# Altium schematic symbol library 6-Connectors 连接器.端子.SchLib: 402 symbols (part 3 of 5)
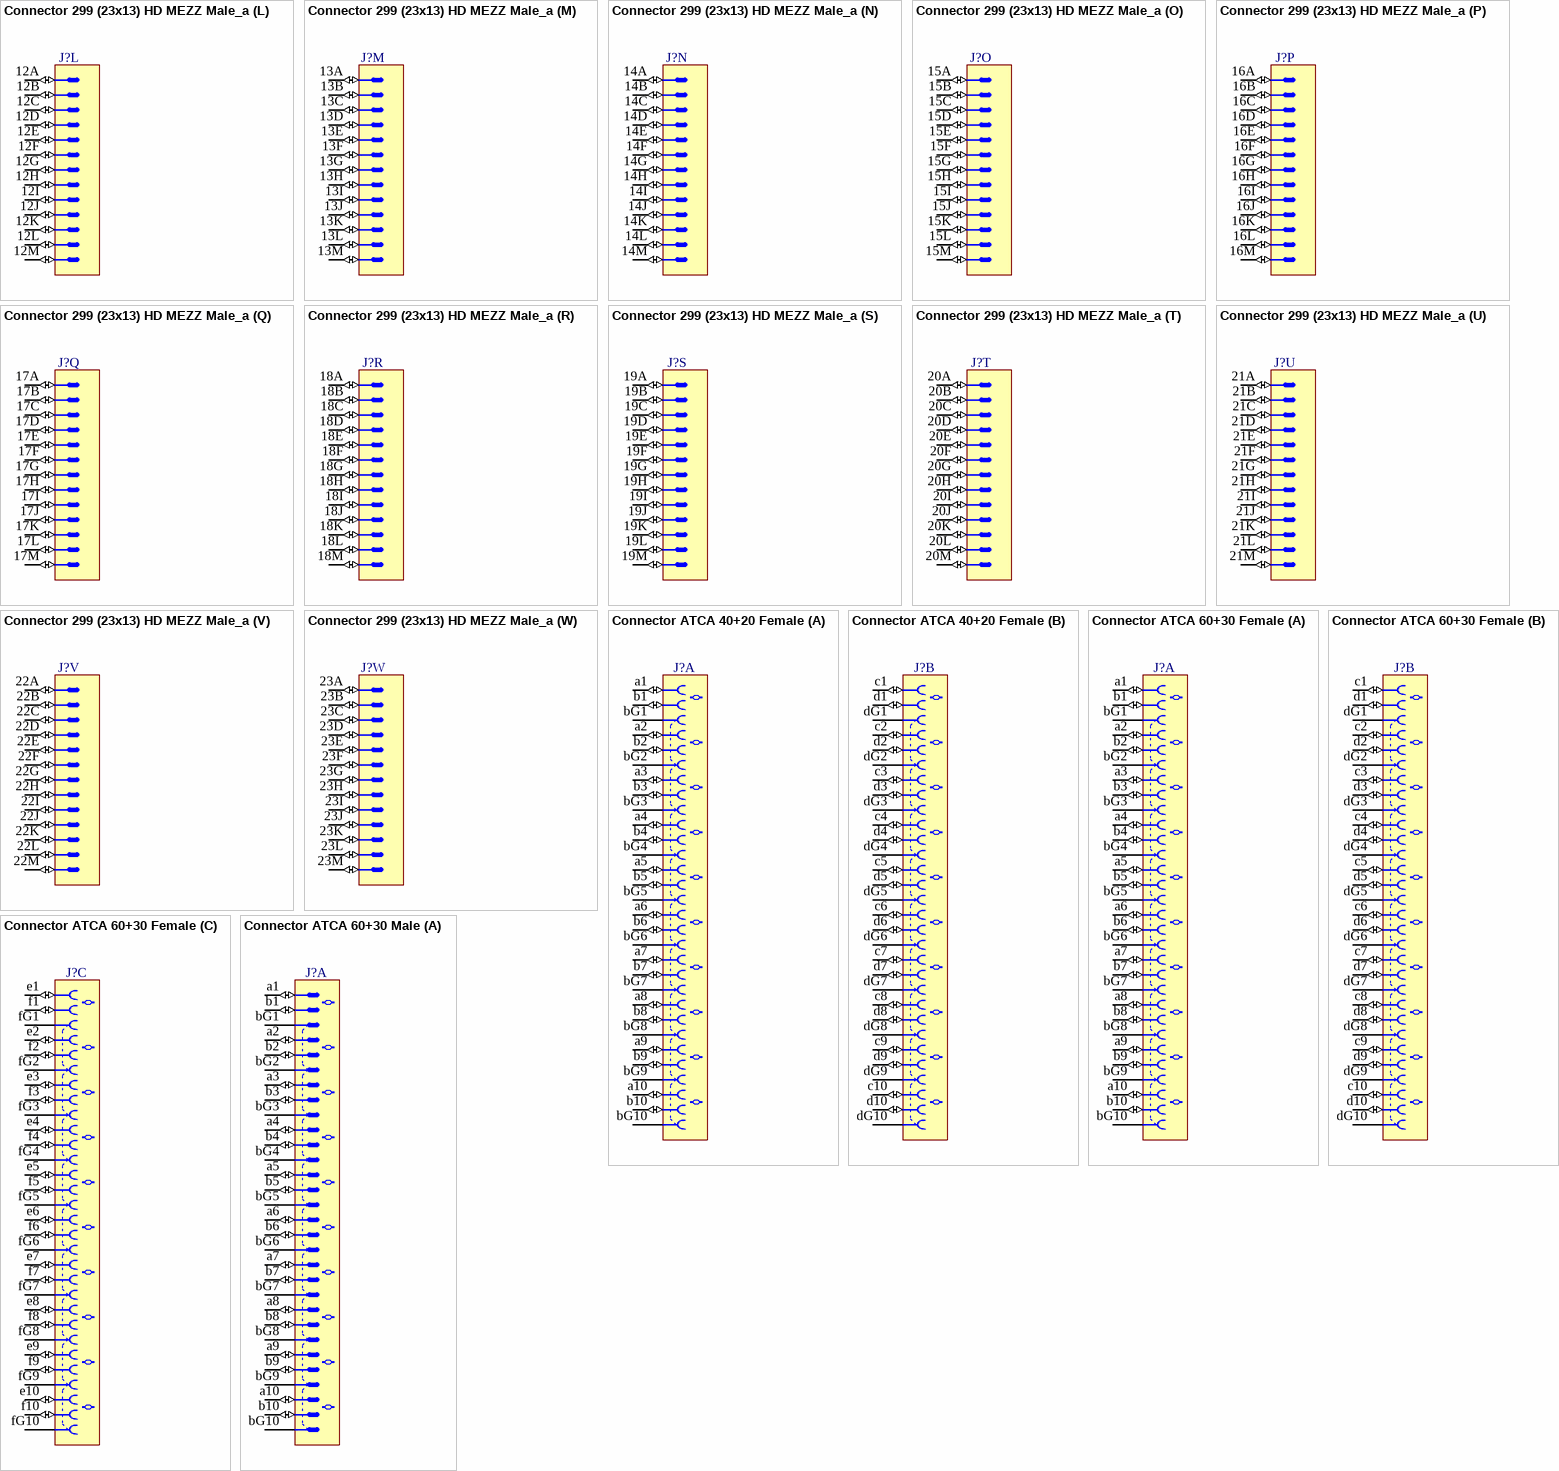
[diagram p51: symbols Connector 299 (23x13) HD MEZZ Male_a to Connector ATCA 60+30 Male]

## Connector 299 (23x13) HD MEZZ Male_a
designator J?
299 Contacts (23 Row  x 13 Column (A to M) HD MEZZ Male Connector
part A pins: 1A (io), 1B (io), 1C (io), 1D (io), 1E (io), 1F (io), 1G (io), 1H (io), 1I (io), 1J (io), 1K (io), 1L (io), 1M (io)
part B pins: 2A (io), 2B (io), 2C (io), 2D (io), 2E (io), 2F (io), 2G (io), 2H (io), 2I (io), 2J (io), 2K (io), 2L (io), 2M (io)
part C pins: 3A (io), 3B (io), 3C (io), 3D (io), 3E (io), 3F (io), 3G (io), 3H (io), 3I (io), 3J (io), 3K (io), 3L (io), 3M (io)
part D pins: 4A (io), 4B (io), 4C (io), 4D (io), 4E (io), 4F (io), 4G (io), 4H (io), 4I (io), 4J (io), 4K (io), 4L (io), 4M (io)
part E pins: 5A (io), 5B (io), 5C (io), 5D (io), 5E (io), 5F (io), 5G (io), 5H (io), 5I (io), 5J (io), 5K (io), 5L (io), 5M (io)
part F pins: 6A (io), 6B (io), 6C (io), 6D (io), 6E (io), 6F (io), 6G (io), 6H (io), 6I (io), 6J (io), 6K (io), 6L (io), 6M (io)
part G pins: 7A (io), 7B (io), 7C (io), 7D (io), 7E (io), 7F (io), 7G (io), 7H (io), 7I (io), 7J (io), 7K (io), 7L (io), 7M (io)
part H pins: 8A (io), 8B (io), 8C (io), 8D (io), 8E (io), 8F (io), 8G (io), 8H (io), 8I (io), 8J (io), 8K (io), 8L (io), 8M (io)
part I pins: 9A (io), 9B (io), 9C (io), 9D (io), 9E (io), 9F (io), 9G (io), 9H (io), 9I (io), 9J (io), 9K (io), 9L (io), 9M (io)
part J pins: 10A (io), 10B (io), 10C (io), 10D (io), 10E (io), 10F (io), 10G (io), 10H (io), 10I (io), 10J (io), 10K (io), 10L (io), 10M (io)
part K pins: 11A (io), 11B (io), 11C (io), 11D (io), 11E (io), 11F (io), 11G (io), 11H (io), 11I (io), 11J (io), 11K (io), 11L (io), 11M (io)
part L pins: 12A (io), 12B (io), 12C (io), 12D (io), 12E (io), 12F (io), 12G (io), 12H (io), 12I (io), 12J (io), 12K (io), 12L (io), 12M (io)
part M pins: 13A (io), 13B (io), 13C (io), 13D (io), 13E (io), 13F (io), 13G (io), 13H (io), 13I (io), 13J (io), 13K (io), 13L (io), 13M (io)
part N pins: 14A (io), 14B (io), 14C (io), 14D (io), 14E (io), 14F (io), 14G (io), 14H (io), 14I (io), 14J (io), 14K (io), 14L (io), 14M (io)
part O pins: 15A (io), 15B (io), 15C (io), 15D (io), 15E (io), 15F (io), 15G (io), 15H (io), 15I (io), 15J (io), 15K (io), 15L (io), 15M (io)
part P pins: 16A (io), 16B (io), 16C (io), 16D (io), 16E (io), 16F (io), 16G (io), 16H (io), 16I (io), 16J (io), 16K (io), 16L (io), 16M (io)
part Q pins: 17A (io), 17B (io), 17C (io), 17D (io), 17E (io), 17F (io), 17G (io), 17H (io), 17I (io), 17J (io), 17K (io), 17L (io), 17M (io)
part R pins: 18A (io), 18B (io), 18C (io), 18D (io), 18E (io), 18F (io), 18G (io), 18H (io), 18I (io), 18J (io), 18K (io), 18L (io), 18M (io)
part S pins: 19A (io), 19B (io), 19C (io), 19D (io), 19E (io), 19F (io), 19G (io), 19H (io), 19I (io), 19J (io), 19K (io), 19L (io), 19M (io)
part T pins: 20A (io), 20B (io), 20C (io), 20D (io), 20E (io), 20F (io), 20G (io), 20H (io), 20I (io), 20J (io), 20K (io), 20L (io), 20M (io)
part U pins: 21A (io), 21B (io), 21C (io), 21D (io), 21E (io), 21F (io), 21G (io), 21H (io), 21I (io), 21J (io), 21K (io), 21L (io), 21M (io)
part V pins: 22A (io), 22B (io), 22C (io), 22D (io), 22E (io), 22F (io), 22G (io), 22H (io), 22I (io), 22J (io), 22K (io), 22L (io), 22M (io)
part W pins: 23A (io), 23B (io), 23C (io), 23D (io), 23E (io), 23F (io), 23G (io), 23H (io), 23I (io), 23J (io), 23K (io), 23L (io), 23M (io)

## Connector ATCA 40+20 Female
designator J?
Connector 40 ATCA Female 20 Pairs (40 Signals) + 2x10 Ground
part A pins: a1 (io), a2 (io), a3 (io), a4 (io), a5 (io), a6 (io), a7 (io), a8 (io), a9 (io), a10 (io), b1 (io), b2 (io), b3 (io), b4 (io), b5 (io), b6 (io), b7 (io), b8 (io), b9 (io), b10 (io), bG1 (power), bG2 (power), bG3 (power), bG4 (power), bG5 (power), bG6 (power), bG7 (power), bG8 (power), bG9 (power), bG10 (power)
part B pins: c1 (io), c2 (io), c3 (io), c4 (io), c5 (io), c6 (io), c7 (io), c8 (io), c9 (io), c10 (io), d1 (io), d2 (io), d3 (io), d4 (io), d5 (io), d6 (io), d7 (io), d8 (io), d9 (io), d10 (io), dG1 (power), dG2 (power), dG3 (power), dG4 (power), dG5 (power), dG6 (power), dG7 (power), dG8 (power), dG9 (power), dG10 (power)

## Connector ATCA 60+30 Female
designator J?
Connector 60 ATCA Female 30 Pairs (60 Signals) + 3x10 Ground
part A pins: a1 (io), a2 (io), a3 (io), a4 (io), a5 (io), a6 (io), a7 (io), a8 (io), a9 (io), a10 (io), b1 (io), b2 (io), b3 (io), b4 (io), b5 (io), b6 (io), b7 (io), b8 (io), b9 (io), b10 (io), bG1 (power), bG2 (power), bG3 (power), bG4 (power), bG5 (power), bG6 (power), bG7 (power), bG8 (power), bG9 (power), bG10 (power)
part B pins: c1 (io), c2 (io), c3 (io), c4 (io), c5 (io), c6 (io), c7 (io), c8 (io), c9 (io), c10 (io), d1 (io), d2 (io), d3 (io), d4 (io), d5 (io), d6 (io), d7 (io), d8 (io), d9 (io), d10 (io), dG1 (power), dG2 (power), dG3 (power), dG4 (power), dG5 (power), dG6 (power), dG7 (power), dG8 (power), dG9 (power), dG10 (power)
part C pins: e1 (io), e2 (io), e3 (io), e4 (io), e5 (io), e6 (io), e7 (io), e8 (io), e9 (io), e10 (io), f1 (io), f2 (io), f3 (io), f4 (io), f5 (io), f6 (io), f7 (io), f8 (io), f9 (io), f10 (io), fG1 (power), fG2 (power), fG3 (power), fG4 (power), fG5 (power), fG6 (power), fG7 (power), fG8 (power), fG9 (power), fG10 (power)

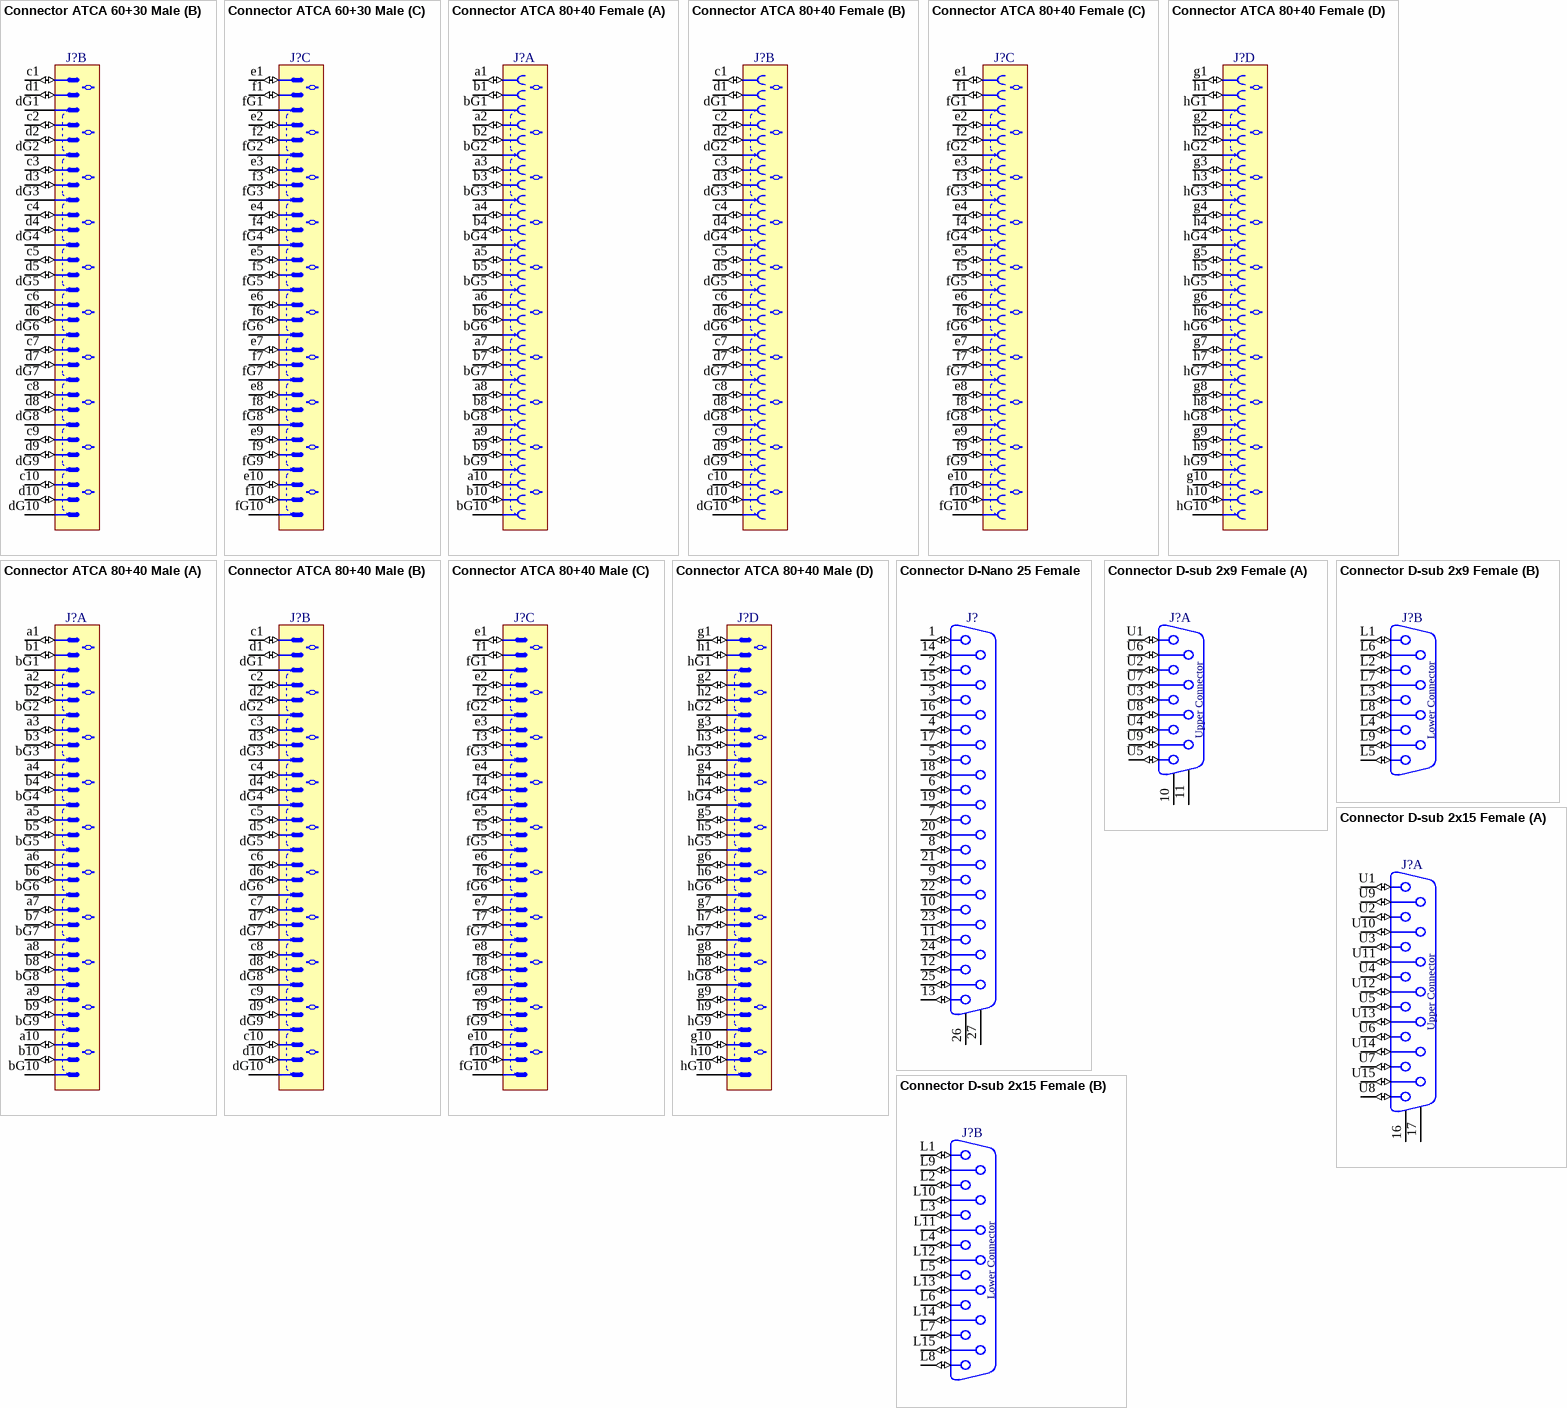
[diagram p25: symbols Connector ATCA 60+30 Male to Connector D-sub 2x15 Female]

## Connector ATCA 60+30 Male
designator J?
Connector 60 ATCA Male 30 Pairs (60 Signals) + 3x10 Ground
part A pins: a1 (io), a2 (io), a3 (io), a4 (io), a5 (io), a6 (io), a7 (io), a8 (io), a9 (io), a10 (io), b1 (io), b2 (io), b3 (io), b4 (io), b5 (io), b6 (io), b7 (io), b8 (io), b9 (io), b10 (io), bG1 (power), bG2 (power), bG3 (power), bG4 (power), bG5 (power), bG6 (power), bG7 (power), bG8 (power), bG9 (power), bG10 (power)
part B pins: c1 (io), c2 (io), c3 (io), c4 (io), c5 (io), c6 (io), c7 (io), c8 (io), c9 (io), c10 (io), d1 (io), d2 (io), d3 (io), d4 (io), d5 (io), d6 (io), d7 (io), d8 (io), d9 (io), d10 (io), dG1 (power), dG2 (power), dG3 (power), dG4 (power), dG5 (power), dG6 (power), dG7 (power), dG8 (power), dG9 (power), dG10 (power)
part C pins: e1 (io), e2 (io), e3 (io), e4 (io), e5 (io), e6 (io), e7 (io), e8 (io), e9 (io), e10 (io), f1 (io), f2 (io), f3 (io), f4 (io), f5 (io), f6 (io), f7 (io), f8 (io), f9 (io), f10 (io), fG1 (power), fG2 (power), fG3 (power), fG4 (power), fG5 (power), fG6 (power), fG7 (power), fG8 (power), fG9 (power), fG10 (power)

## Connector ATCA 80+40 Female
designator J?
Connector 80 ATCA Female 40 Pairs (80 Signals) + 4x10 Ground
part A pins: a1 (io), a2 (io), a3 (io), a4 (io), a5 (io), a6 (io), a7 (io), a8 (io), a9 (io), a10 (io), b1 (io), b2 (io), b3 (io), b4 (io), b5 (io), b6 (io), b7 (io), b8 (io), b9 (io), b10 (io), bG1 (power), bG2 (power), bG3 (power), bG4 (power), bG5 (power), bG6 (power), bG7 (power), bG8 (power), bG9 (power), bG10 (power)
part B pins: c1 (io), c2 (io), c3 (io), c4 (io), c5 (io), c6 (io), c7 (io), c8 (io), c9 (io), c10 (io), d1 (io), d2 (io), d3 (io), d4 (io), d5 (io), d6 (io), d7 (io), d8 (io), d9 (io), d10 (io), dG1 (power), dG2 (power), dG3 (power), dG4 (power), dG5 (power), dG6 (power), dG7 (power), dG8 (power), dG9 (power), dG10 (power)
part C pins: e1 (io), e2 (io), e3 (io), e4 (io), e5 (io), e6 (io), e7 (io), e8 (io), e9 (io), e10 (io), f1 (io), f2 (io), f3 (io), f4 (io), f5 (io), f6 (io), f7 (io), f8 (io), f9 (io), f10 (io), fG1 (power), fG2 (power), fG3 (power), fG4 (power), fG5 (power), fG6 (power), fG7 (power), fG8 (power), fG9 (power), fG10 (power)
part D pins: g1 (io), g2 (io), g3 (io), g4 (io), g5 (io), g6 (io), g7 (io), g8 (io), g9 (io), g10 (io), h1 (io), h2 (io), h3 (io), h4 (io), h5 (io), h6 (io), h7 (io), h8 (io), h9 (io), h10 (io), hG1 (power), hG2 (power), hG3 (power), hG4 (power), hG5 (power), hG6 (power), hG7 (power), hG8 (power), hG9 (power), hG10 (power)

## Connector ATCA 80+40 Male
designator J?
Connector 80 ATCA Male 40 Pairs (80 Signals) + 4x10 Ground
part A pins: a1 (io), a2 (io), a3 (io), a4 (io), a5 (io), a6 (io), a7 (io), a8 (io), a9 (io), a10 (io), b1 (io), b2 (io), b3 (io), b4 (io), b5 (io), b6 (io), b7 (io), b8 (io), b9 (io), b10 (io), bG1 (power), bG2 (power), bG3 (power), bG4 (power), bG5 (power), bG6 (power), bG7 (power), bG8 (power), bG9 (power), bG10 (power)
part B pins: c1 (io), c2 (io), c3 (io), c4 (io), c5 (io), c6 (io), c7 (io), c8 (io), c9 (io), c10 (io), d1 (io), d2 (io), d3 (io), d4 (io), d5 (io), d6 (io), d7 (io), d8 (io), d9 (io), d10 (io), dG1 (power), dG2 (power), dG3 (power), dG4 (power), dG5 (power), dG6 (power), dG7 (power), dG8 (power), dG9 (power), dG10 (power)
part C pins: e1 (io), e2 (io), e3 (io), e4 (io), e5 (io), e6 (io), e7 (io), e8 (io), e9 (io), e10 (io), f1 (io), f2 (io), f3 (io), f4 (io), f5 (io), f6 (io), f7 (io), f8 (io), f9 (io), f10 (io), fG1 (power), fG2 (power), fG3 (power), fG4 (power), fG5 (power), fG6 (power), fG7 (power), fG8 (power), fG9 (power), fG10 (power)
part D pins: g1 (io), g2 (io), g3 (io), g4 (io), g5 (io), g6 (io), g7 (io), g8 (io), g9 (io), g10 (io), h1 (io), h2 (io), h3 (io), h4 (io), h5 (io), h6 (io), h7 (io), h8 (io), h9 (io), h10 (io), hG1 (power), hG2 (power), hG3 (power), hG4 (power), hG5 (power), hG6 (power), hG7 (power), hG8 (power), hG9 (power), hG10 (power)

## Connector D-Nano 25 Female
designator J?
Connector Nano-D 25 Female
pins: 1 (io), 2 (io), 3 (io), 4 (io), 5 (io), 6 (io), 7 (io), 8 (io), 9 (io), 10 (io), 11 (io), 12 (io), 13 (io), 14 (io), 15 (io), 16 (io), 17 (io), 18 (io), 19 (io), 20 (io), 21 (io), 22 (io), 23 (io), 24 (io), 25 (io), 26, 27
1 alternate drawing of the same symbol

## Connector D-sub 2x9 Female
designator J?
Connector D-sub 2x9 Female
part A pins: 10, 11, U1 (io), U2 (io), U3 (io), U4 (io), U5 (io), U6 (io), U7 (io), U8 (io), U9 (io)
part B pins: L1 (io), L2 (io), L3 (io), L4 (io), L5 (io), L6 (io), L7 (io), L8 (io), L9 (io)
part A text: Upper Connector
part B text: Lower Connector

## Connector D-sub 2x15 Female
designator J?
Connector D-sub 2x15 Female
part A pins: 16, 17, U1 (io), U2 (io), U3 (io), U4 (io), U5 (io), U6 (io), U7 (io), U8 (io), U9 (io), U10 (io), U11 (io), U12 (io), U13 (io), U14 (io), U15 (io)
part B pins: L1 (io), L2 (io), L3 (io), L4 (io), L5 (io), L6 (io), L7 (io), L8 (io), L9 (io), L10 (io), L11 (io), L12 (io), L13 (io), L14 (io), L15 (io)
part A text: Upper Connector
part B text: Lower Connector

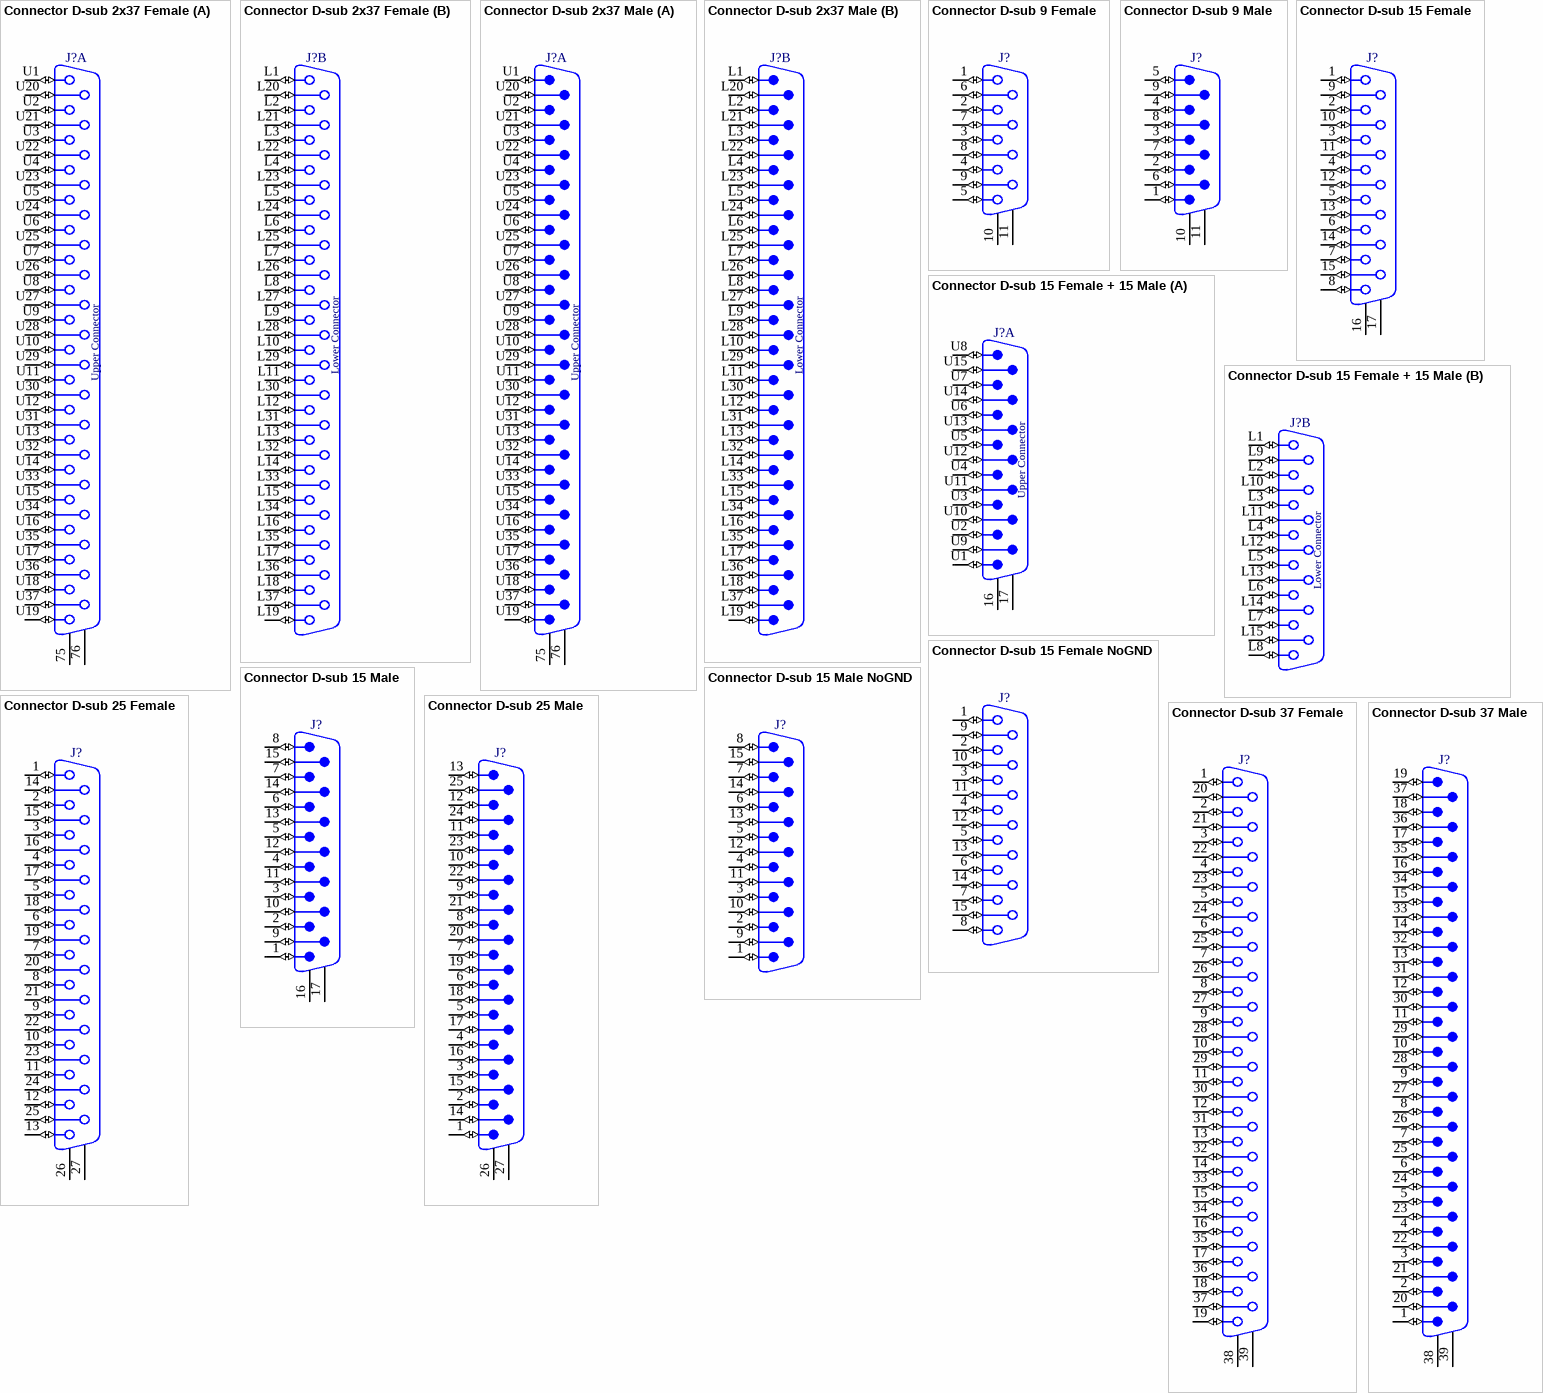
[diagram p26: symbols Connector D-sub 2x37 Female to Connector D-sub 37 Male]

## Connector D-sub 2x37 Female
designator J?
Connector D-sub 2x37 Female
part A pins: 75, 76, U1 (io), U2 (io), U3 (io), U4 (io), U5 (io), U6 (io), U7 (io), U8 (io), U9 (io), U10 (io), U11 (io), U12 (io), U13 (io), U14 (io), U15 (io), U16 (io), U17 (io), U18 (io), U19 (io), U20 (io), U21 (io), U22 (io), U23 (io), U24 (io), U25 (io), U26 (io), U27 (io), U28 (io), U29 (io), U30 (io), U31 (io), U32 (io), U33 (io), U34 (io), U35 (io), U36 (io), U37 (io)
part B pins: L1 (io), L2 (io), L3 (io), L4 (io), L5 (io), L6 (io), L7 (io), L8 (io), L9 (io), L10 (io), L11 (io), L12 (io), L13 (io), L14 (io), L15 (io), L16 (io), L17 (io), L18 (io), L19 (io), L20 (io), L21 (io), L22 (io), L23 (io), L24 (io), L25 (io), L26 (io), L27 (io), L28 (io), L29 (io), L30 (io), L31 (io), L32 (io), L33 (io), L34 (io), L35 (io), L36 (io), L37 (io)
part A text: Upper Connector
part B text: Lower Connector

## Connector D-sub 2x37 Male
designator J?
Connector D-sub 2x37 Male
part A pins: 75, 76, U1 (io), U2 (io), U3 (io), U4 (io), U5 (io), U6 (io), U7 (io), U8 (io), U9 (io), U10 (io), U11 (io), U12 (io), U13 (io), U14 (io), U15 (io), U16 (io), U17 (io), U18 (io), U19 (io), U20 (io), U21 (io), U22 (io), U23 (io), U24 (io), U25 (io), U26 (io), U27 (io), U28 (io), U29 (io), U30 (io), U31 (io), U32 (io), U33 (io), U34 (io), U35 (io), U36 (io), U37 (io)
part B pins: L1 (io), L2 (io), L3 (io), L4 (io), L5 (io), L6 (io), L7 (io), L8 (io), L9 (io), L10 (io), L11 (io), L12 (io), L13 (io), L14 (io), L15 (io), L16 (io), L17 (io), L18 (io), L19 (io), L20 (io), L21 (io), L22 (io), L23 (io), L24 (io), L25 (io), L26 (io), L27 (io), L28 (io), L29 (io), L30 (io), L31 (io), L32 (io), L33 (io), L34 (io), L35 (io), L36 (io), L37 (io)
part A text: Upper Connector
part B text: Lower Connector

## Connector D-sub 9 Female
designator J?
Connector D-sub 9 Female
pins: 1 (io), 2 (io), 3 (io), 4 (io), 5 (io), 6 (io), 7 (io), 8 (io), 9 (io), 10, 11
1 alternate drawing of the same symbol

## Connector D-sub 9 Male
designator J?
Connector D-sub 9 Male
pins: 1 (io), 2 (io), 3 (io), 4 (io), 5 (io), 6 (io), 7 (io), 8 (io), 9 (io), 10, 11
1 alternate drawing of the same symbol

## Connector D-sub 15 Female
designator J?
Connector D-sub 15 Female
pins: 1 (io), 2 (io), 3 (io), 4 (io), 5 (io), 6 (io), 7 (io), 8 (io), 9 (io), 10 (io), 11 (io), 12 (io), 13 (io), 14 (io), 15 (io), 16, 17
1 alternate drawing of the same symbol

## Connector D-sub 15 Female + 15 Male
designator J?
Connector D-sub 15 Female + 15 Male
part A pins: 16, 17, U1 (io), U2 (io), U3 (io), U4 (io), U5 (io), U6 (io), U7 (io), U8 (io), U9 (io), U10 (io), U11 (io), U12 (io), U13 (io), U14 (io), U15 (io)
part B pins: L1 (io), L2 (io), L3 (io), L4 (io), L5 (io), L6 (io), L7 (io), L8 (io), L9 (io), L10 (io), L11 (io), L12 (io), L13 (io), L14 (io), L15 (io)
part A text: Upper Connector
part B text: Lower Connector

## Connector D-sub 15 Female NoGND
designator J?
Connector D-sub 15 Female Without Grounding-Pins
pins: 1 (io), 2 (io), 3 (io), 4 (io), 5 (io), 6 (io), 7 (io), 8 (io), 9 (io), 10 (io), 11 (io), 12 (io), 13 (io), 14 (io), 15 (io)
1 alternate drawing of the same symbol

## Connector D-sub 15 Male
designator J?
Connector D-sub 15 Male
pins: 1 (io), 2 (io), 3 (io), 4 (io), 5 (io), 6 (io), 7 (io), 8 (io), 9 (io), 10 (io), 11 (io), 12 (io), 13 (io), 14 (io), 15 (io), 16, 17
1 alternate drawing of the same symbol

## Connector D-sub 15 Male NoGND
designator J?
Connector D-sub 15 Male Without Grounding-Pins
pins: 1 (io), 2 (io), 3 (io), 4 (io), 5 (io), 6 (io), 7 (io), 8 (io), 9 (io), 10 (io), 11 (io), 12 (io), 13 (io), 14 (io), 15 (io)
1 alternate drawing of the same symbol

## Connector D-sub 25 Female
designator J?
Connector D-sub 25 Female
pins: 1 (io), 2 (io), 3 (io), 4 (io), 5 (io), 6 (io), 7 (io), 8 (io), 9 (io), 10 (io), 11 (io), 12 (io), 13 (io), 14 (io), 15 (io), 16 (io), 17 (io), 18 (io), 19 (io), 20 (io), 21 (io), 22 (io), 23 (io), 24 (io), 25 (io), 26, 27
1 alternate drawing of the same symbol

## Connector D-sub 25 Male
designator J?
Connector D-sub 25 Male
pins: 1 (io), 2 (io), 3 (io), 4 (io), 5 (io), 6 (io), 7 (io), 8 (io), 9 (io), 10 (io), 11 (io), 12 (io), 13 (io), 14 (io), 15 (io), 16 (io), 17 (io), 18 (io), 19 (io), 20 (io), 21 (io), 22 (io), 23 (io), 24 (io), 25 (io), 26, 27
1 alternate drawing of the same symbol

## Connector D-sub 37 Female
designator J?
Connector D-sub 37 Female
pins: 1 (io), 2 (io), 3 (io), 4 (io), 5 (io), 6 (io), 7 (io), 8 (io), 9 (io), 10 (io), 11 (io), 12 (io), 13 (io), 14 (io), 15 (io), 16 (io), 17 (io), 18 (io), 19 (io), 20 (io), 21 (io), 22 (io), 23 (io), 24 (io), 25 (io), 26 (io), 27 (io), 28 (io), 29 (io), 30 (io), 31 (io), 32 (io), 33 (io), 34 (io), 35 (io), 36 (io), 37 (io), 38, 39
1 alternate drawing of the same symbol

## Connector D-sub 37 Male
designator J?
Connector D-sub 37 Male
pins: 1 (io), 2 (io), 3 (io), 4 (io), 5 (io), 6 (io), 7 (io), 8 (io), 9 (io), 10 (io), 11 (io), 12 (io), 13 (io), 14 (io), 15 (io), 16 (io), 17 (io), 18 (io), 19 (io), 20 (io), 21 (io), 22 (io), 23 (io), 24 (io), 25 (io), 26 (io), 27 (io), 28 (io), 29 (io), 30 (io), 31 (io), 32 (io), 33 (io), 34 (io), 35 (io), 36 (io), 37 (io), 38, 39
1 alternate drawing of the same symbol
